# Altium footprint library 691 314 520 1xx.PcbLib: 23 footprints (part 1 of 2)
Each footprint in its own frame and in the unit in brackets; x right, y up, seen from the top. Pads: shape width x height; smd on the part's side, far side on the other; paste and mask are expansions set on the pad; w line width, h text height; cw(c..) or ccw(c..) is an arc to the next point about the centre after c.
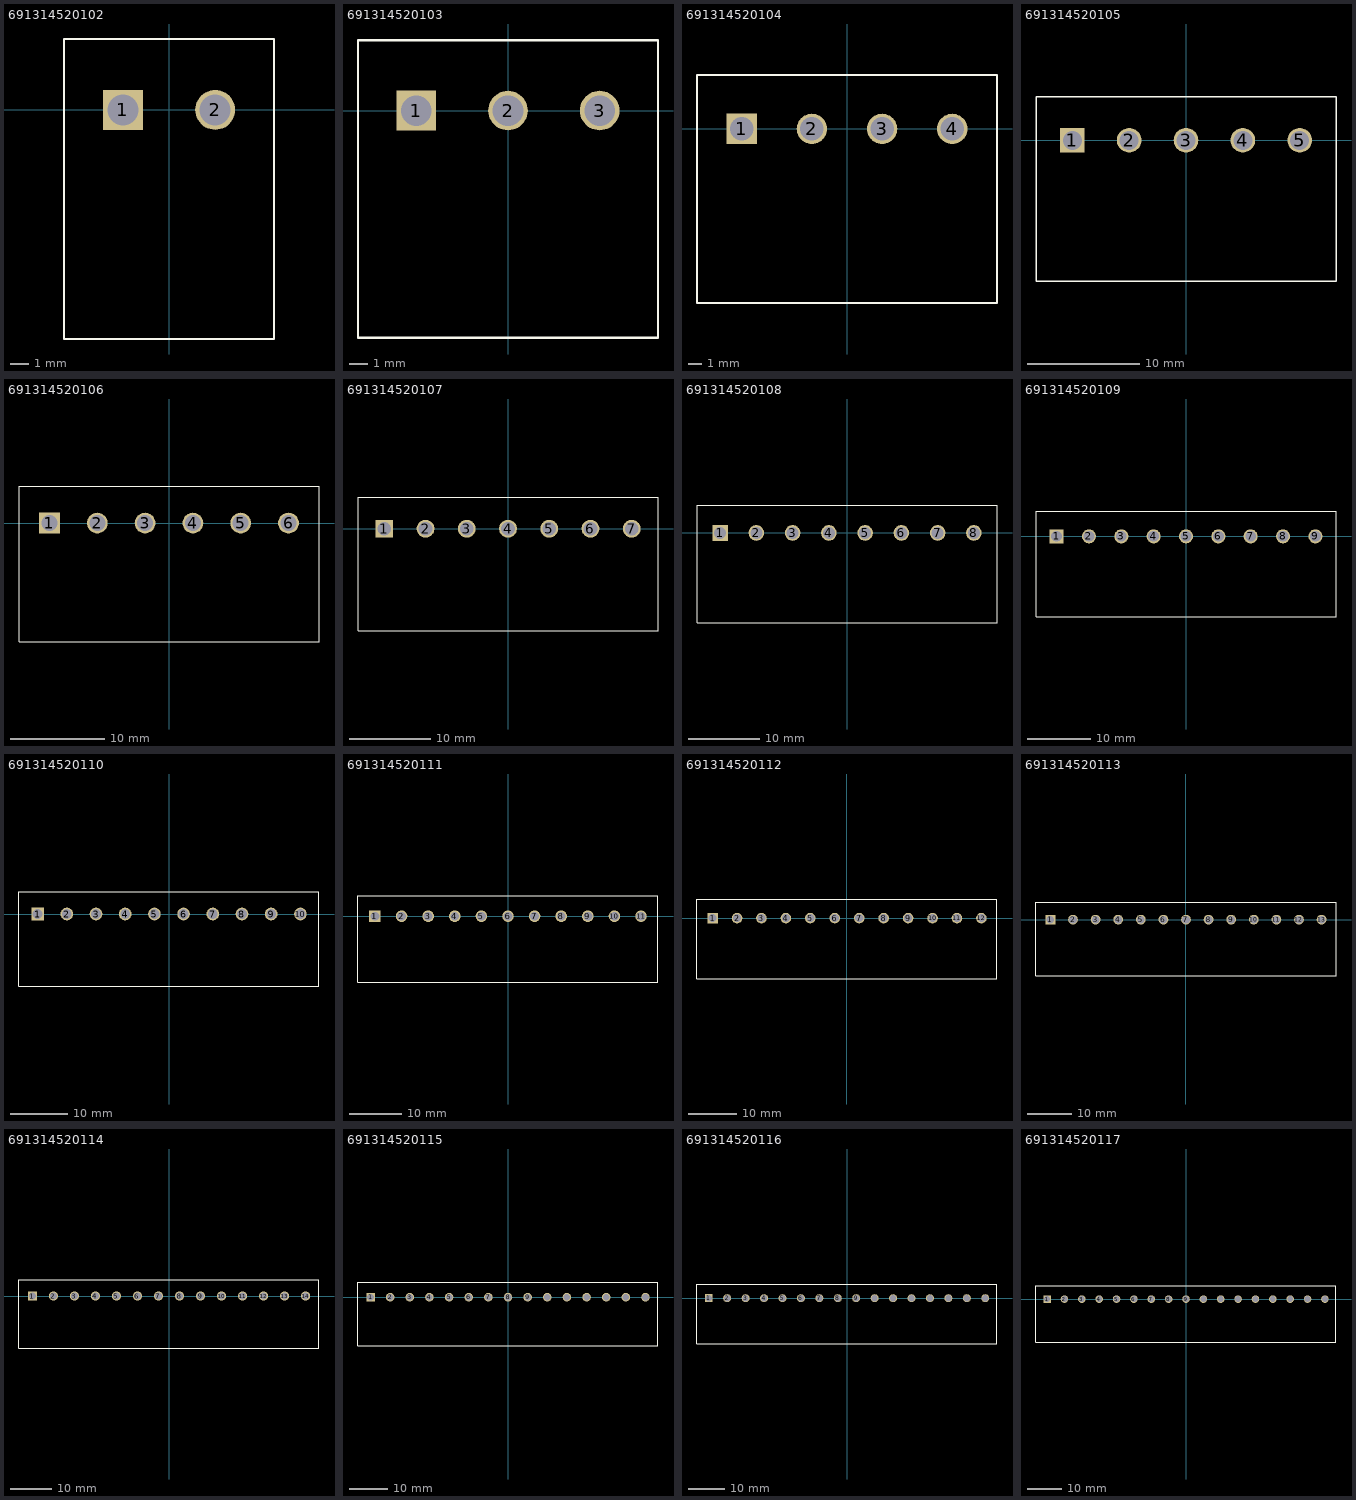
[diagram p0: the footprints below, top view; thin cyan lines are the x and y axes]

## 691314520102 [mm] "5,08mm - PCB Headers - 45°- 02p"
height 14.5
pads (2):
  rect 2.2x2.2 hole 1.7: 1(-2.54,0)
  round 2.2 hole 1.7: 2(2.54,0)
Top Overlay:
  lines w0.127: -5.78,-12.6 -5.78,3.9 5.78,3.9 5.78,-12.6 -5.78,-12.6
3D body: height 14.51, standoff -4.09, extent -5.78,-12.6 5.78,3.9

## 691314520103 [mm] "5,08mm - PCB Headers - 45°- 03p"
height 14.5
pads (3):
  rect 2.2x2.2 hole 1.7: 1(-5.08,0)
  round 2.2 hole 1.7: 2(0,0) 3(5.08,0)
Top Overlay:
  lines w0.127: -8.32,-12.6 8.32,-12.6 8.32,3.9 -8.32,3.9 -8.32,-12.6
3D body: height 14.51, standoff -4.09, extent -8.32,-12.6 8.32,3.9

## 691314520104 [mm] "5,08mm - PCB Headers - 45°- 04p"
height 14.5
pads (4):
  rect 2.2x2.2 hole 1.7: 1(-7.62,0)
  round 2.2 hole 1.7: 2(-2.54,0) 3(2.54,0) 4(7.62,0)
Top Overlay:
  lines w0.127: -10.86,-12.6 10.86,-12.6 10.86,3.9 -10.86,3.9 -10.86,-12.6
3D body: height 14.51, standoff -4.09, extent -10.86,-12.6 10.86,3.9

## 691314520105 [mm] "5,08mm - PCB Headers - 45°- 05p"
height 14.5
pads (5):
  rect 2.2x2.2 hole 1.7: 1(-10.16,0)
  round 2.2 hole 1.7: 2(-5.08,0) 3(0,0) 4(5.08,0) 5(10.16,0)
Top Overlay:
  lines w0.127: -13.4,-12.6 13.4,-12.6 13.4,3.9 -13.4,3.9 -13.4,-12.6
3D body: height 14.51, standoff -4.09, extent -13.4,-12.6 13.4,3.9

## 691314520106 [mm] "5,08mm - PCB Headers - 45°- 06p"
height 14.5
pads (6):
  rect 2.2x2.2 hole 1.7: 1(-12.7,0)
  round 2.2 hole 1.7: 2(-7.62,0) 3(-2.54,0) 4(2.54,0) 5(7.62,0) 6(12.7,0)
Top Overlay:
  lines w0.127: -15.94,-12.6 15.94,-12.6 15.94,3.9 -15.94,3.9 -15.94,-12.6
3D body: height 14.51, standoff -4.09, extent -15.94,-12.6 15.94,3.9

## 691314520107 [mm] "5,08mm - PCB Headers - 45°- 07p"
height 14.5
pads (7):
  rect 2.2x2.2 hole 1.7: 1(-15.24,0)
  round 2.2 hole 1.7: 2(-10.16,0) 3(-5.08,0) 4(0,0) 5(5.08,0) 6(10.16,0) 7(15.24,0)
Top Overlay:
  lines w0.127: -18.48,-12.6 -18.48,3.9 18.48,3.9 18.48,-12.6 -18.48,-12.6
3D body: height 14.51, standoff -4.09, extent -18.48,-12.6 18.48,3.9

## 691314520108 [mm] "5,08mm - PCB Headers - 45°- 08p"
height 14.5
pads (8):
  rect 2.2x2.2 hole 1.7: 1(-17.78,0)
  round 2.2 hole 1.7: 2(-12.7,0) 3(-7.62,0) 4(-2.54,0) 5(2.54,0) 6(7.62,0) 7(12.7,0) 8(17.78,0)
Top Overlay:
  lines w0.127: -21.02,-12.6 -21.02,3.9 21.02,3.9 21.02,-12.6 -21.02,-12.6
3D body: height 14.51, standoff -4.09, extent -21.02,-12.6 21.02,3.9

## 691314520109 [mm] "5,08mm - PCB Headers - 45°- 09p"
height 14.5
pads (9):
  rect 2.2x2.2 hole 1.7: 1(-20.32,0)
  round 2.2 hole 1.7: 2(-15.24,0) 3(-10.16,0) 4(-5.08,0) 5(0,0) 6(5.08,0) 7(10.16,0) 8(15.24,0) 9(20.32,0)
Top Overlay:
  lines w0.127: -23.56,-12.6 23.56,-12.6 23.56,3.9 -23.56,3.9 -23.56,-12.6
3D body: height 14.51, standoff -4.09, extent -23.56,-12.6 23.56,3.9

## 691314520110 [mm] "5,08mm - PCB Headers - 45°- 10p"
height 14.5
pads (10):
  rect 2.2x2.2 hole 1.7: 1(-22.86,0)
  round 2.2 hole 1.7: 2(-17.78,0) 3(-12.7,0) 4(-7.62,0) 5(-2.54,0) 6(2.54,0) 7(7.62,0) 8(12.7,0) 9(17.78,0) 10(22.86,0)
Top Overlay:
  lines w0.127: -26.1,-12.6 -26.1,3.9 26.1,3.9 26.1,-12.6 -26.1,-12.6
3D body: height 14.51, standoff -4.09, extent -26.1,-12.6 26.1,3.9

## 691314520111 [mm] "5,08mm - PCB Headers - 45°- 11p"
height 14.5
pads (11):
  rect 2.2x2.2 hole 1.7: 1(-25.4,0)
  round 2.2 hole 1.7: 2(-20.32,0) 3(-15.24,0) 4(-10.16,0) 5(-5.08,0) 6(0,0) 7(5.08,0) 8(10.16,0) 9(15.24,0) 10(20.32,0) 11(25.4,0)
Top Overlay:
  lines w0.127: -28.64,-12.6 -28.64,3.9 28.64,3.9 28.64,-12.6 -28.64,-12.6
3D body: height 14.51, standoff -4.09, extent -28.64,-12.6 28.64,3.9

## 691314520112 [mm] "5,08mm - PCB Headers - 45°- 12p"
height 14.5
pads (12):
  rect 2.2x2.2 hole 1.7: 1(-27.94,0)
  round 2.2 hole 1.7: 2(-22.86,0) 3(-17.78,0) 4(-12.7,0) 5(-7.62,0) 6(-2.54,0) 7(2.54,0) 8(7.62,0) 9(12.7,0) 10(17.78,0) 11(22.86,0) 12(27.94,0)
Top Overlay:
  lines w0.127: -31.18,-12.6 31.18,-12.6 31.18,3.9 -31.18,3.9 -31.18,-12.6
3D body: height 14.51, standoff -4.09, extent -31.18,-12.6 31.18,3.9

## 691314520113 [mm] "5,08mm - PCB Headers - 45°- 13p"
height 14.5
pads (13):
  rect 2.2x2.2 hole 1.7: 1(-30.48,0)
  round 2.2 hole 1.7: 2(-25.4,0) 3(-20.32,0) 4(-15.24,0) 5(-10.16,0) 6(-5.08,0) 7(0,0) 8(5.08,0) 9(10.16,0) 10(15.24,0) 11(20.32,0) 12(25.4,0) 13(30.48,0)
Top Overlay:
  lines w0.127: -33.72,-12.6 33.72,-12.6 33.72,3.9 -33.72,3.9 -33.72,-12.6
3D body: height 14.51, standoff -4.09, extent -33.72,-12.6 33.72,3.9

## 691314520114 [mm] "5,08mm - PCB Headers - 45°- 14p"
height 14.5
pads (14):
  rect 2.2x2.2 hole 1.7: 1(-33.02,0)
  round 2.2 hole 1.7: 2(-27.94,0) 3(-22.86,0) 4(-17.78,0) 5(-12.7,0) 6(-7.62,0) 7(-2.54,0) 8(2.54,0) 9(7.62,0) 10(12.7,0) 11(17.78,0) 12(22.86,0) 13(27.94,0) 14(33.02,0)
Top Overlay:
  lines w0.127: -36.26,-12.6 36.26,-12.6 36.26,3.9 -36.26,3.9 -36.26,-12.6
3D body: height 14.51, standoff -4.09, extent -36.26,-12.6 36.26,3.9

## 691314520115 [mm] "5,08mm - PCB Headers - 45°- 15p"
height 14.5
pads (15):
  rect 2.2x2.2 hole 1.7: 1(-35.56,0)
  round 2.2 hole 1.7: 2(-30.48,0) 3(-25.4,0) 4(-20.32,0) 5(-15.24,0) 6(-10.16,0) 7(-5.08,0) 8(0,0) 9(5.08,0) 10(10.16,0) 11(15.24,0) 12(20.32,0) 13(25.4,0) 14(30.48,0) 15(35.56,0)
Top Overlay:
  lines w0.127: -38.8,-12.6 38.8,-12.6 38.8,3.9 -38.8,3.9 -38.8,-12.6
3D body: height 14.51, standoff -4.09, extent -38.8,-12.6 38.8,3.9

## 691314520116 [mm] "5,08mm - PCB Headers - 45°- 16p"
height 14.5
pads (16):
  rect 2.2x2.2 hole 1.7: 1(-38.1,0)
  round 2.2 hole 1.7: 2(-33.02,0) 3(-27.94,0) 4(-22.86,0) 5(-17.78,0) 6(-12.7,0) 7(-7.62,0) 8(-2.54,0) 9(2.54,0) 10(7.62,0) 11(12.7,0) 12(17.78,0) 13(22.86,0) 14(27.94,0) 15(33.02,0) 16(38.1,0)
Top Overlay:
  lines w0.127: -41.34,-12.6 41.34,-12.6 41.34,3.9 -41.34,3.9 -41.34,-12.6
3D body: height 14.51, standoff -4.09, extent -41.34,-12.6 41.34,3.9

## 691314520117 [mm] "5,08mm - PCB Headers - 45°- 17p"
height 14.5
pads (17):
  rect 2.2x2.2 hole 1.7: 1(-40.64,0)
  round 2.2 hole 1.7: 2(-35.56,0) 3(-30.48,0) 4(-25.4,0) 5(-20.32,0) 6(-15.24,0) 7(-10.16,0) 8(-5.08,0) 9(0,0) 10(5.08,0) 11(10.16,0) 12(15.24,0) 13(20.32,0) 14(25.4,0) 15(30.48,0) 16(35.56,0) 17(40.64,0)
Top Overlay:
  lines w0.127: -43.88,-12.6 43.88,-12.6 43.88,3.9 -43.88,3.9 -43.88,-12.6
3D body: height 14.51, standoff -4.09, extent -43.88,-12.6 43.88,3.9